# Altium footprint library 769BI_LTDC.PcbLib: 51 footprints (part 2 of 4)
Each footprint in its own frame and in the unit in brackets; x right, y up, seen from the top. Pads: shape width x height; smd on the part's side, far side on the other; paste and mask are expansions set on the pad; w line width, h text height; cw(c..) or ccw(c..) is an arc to the next point about the centre after c.
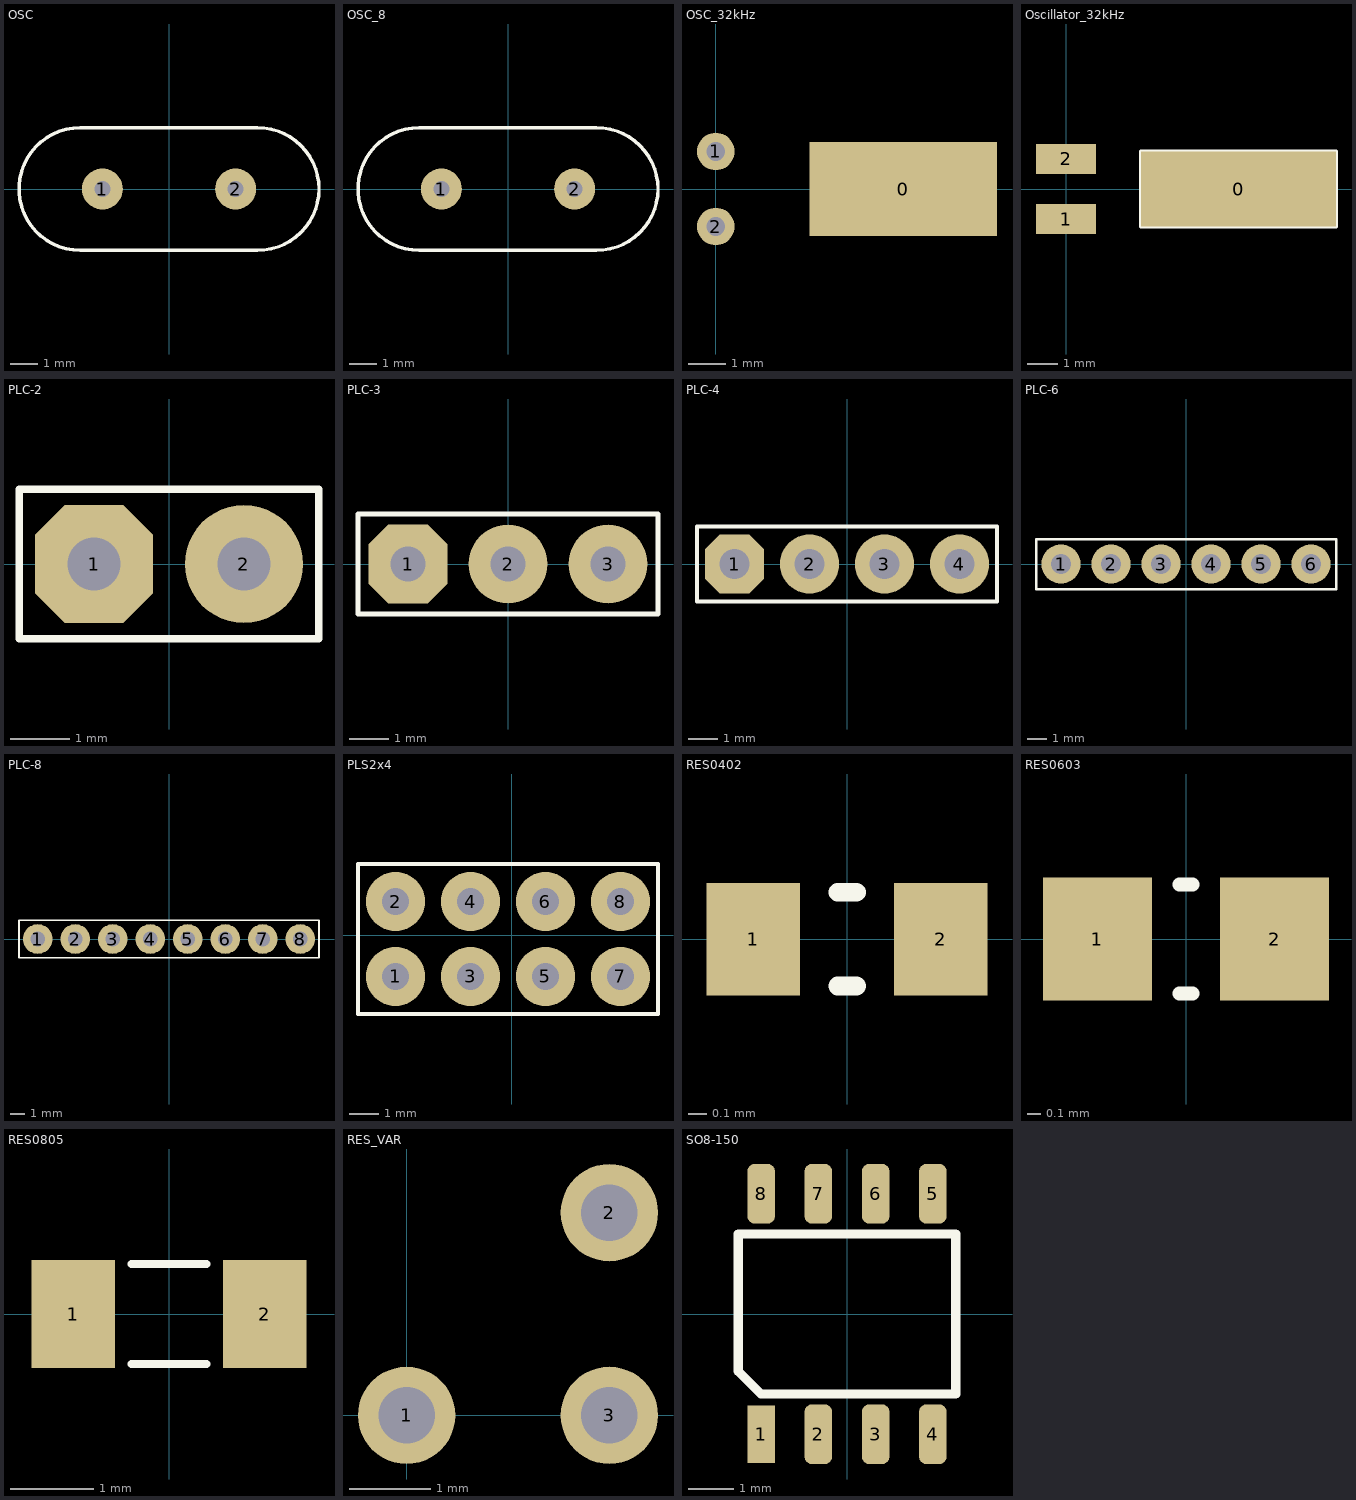
[diagram p1: the footprints below, top view; thin cyan lines are the x and y axes]

## OSC [mm]
pads (2):
  round 1.5 hole 0.6: 1(-2.44,0) 2(2.44,0)
Top Overlay:
  lines w0.127: 3.239,-2.25 -3.25,-2.25 cw(c-3.25,0) -3.25,2.25 3.24,2.25 cw(c3.25,0) 3.239,-2.25
3D body "HP49US.STEP": height 3.7, standoff -2.5, extent -5.5,-2.25 5.5,2.25

## OSC_8 [mm]
pads (2):
  round 1.5 hole 0.6: 1(-2.44,0) 2(2.44,0)
Top Overlay:
  lines w0.127: 3.239,-2.25 -3.25,-2.25 cw(c-3.25,0) -3.25,2.25 3.24,2.25 cw(c3.25,0) 3.239,-2.25
3D body "HP49US.STEP": height 3.7, standoff -2.5, extent -5.5,-2.25 5.5,2.25

## OSC_32kHz [mm]
pads (3):
  rect 5x2.5 smd: 0(5,0)
  round 1 hole 0.5: 1(0,1) 2(0,-1)
3D body "User Library-DT-26-1.STEP": height 3, standoff -1, extent 0.11,-1 7.25,1

## Oscillator_32kHz [mm]
pads (3):
  rect 6.5x2.5 smd: 0(5.75,0)
  rect 2x1 smd: 1(0,-1) 2(0,1)
Top Overlay:
  lines w0.127: 2.5,-1.25 2.5,1.25 9,1.25 9,1 9,-1 9,-1.25 2.5,-1.25
3D body "User Library-DT-26-1.STEP": height 1, standoff -3, extent 1.43,-1 8.57,1

## PCBComponent_1 [mm]

## PLC-2 [mm]
pads (2):
  oct 2x2 hole 0.9: 1(-1.27,0)
  round 2 hole 0.9: 2(1.27,0)
Top Overlay:
  lines w0.127: -2.54,-1.27 2.54,-1.27 2.54,1.27 -2.54,1.27 -2.54,-1.27
3D body "HN-1x2.STEP": height 10.1, standoff -1.5, extent -2.54,-1.27 2.54,1.27

## PLC-3 [mm]
pads (3):
  oct 2x2 hole 0.9: 1(-2.54,0)
  round 2 hole 0.9: 2(0,0) 3(2.54,0)
Top Overlay:
  lines w0.127: -3.81,-1.27 3.81,-1.27 3.81,1.27 -3.81,1.27 -3.81,-1.27
3D body "HN-1x3.STEP": height 10.1, standoff -1.5, extent -3.81,-1.27 3.81,1.27

## PLC-4 [mm]
pads (4):
  oct 2x2 hole 1: 1(-3.81,0)
  round 2 hole 1: 2(-1.27,0) 3(1.27,0) 4(3.81,0)
Top Overlay:
  lines w0.127: -5.08,-1.27 5.08,-1.27 5.08,1.27 -5.08,1.27 -5.08,-1.27
3D body "HN-1x4.STEP": height 10.1, standoff -1.5, extent -5.08,-1.27 5.08,1.27

## PLC-6 [mm]
pads (6):
  round 2 hole 1: 1(-6.35,0) 2(-3.81,0) 3(-1.27,0) 4(1.27,0) 5(3.81,0) 6(6.35,0)
Top Overlay:
  lines w0.127: -7.62,-1.27 7.62,-1.27 7.62,1.27 -7.62,1.27 -7.62,-1.27
3D body "HN-1x6.step": height 10.1, standoff -1.5, extent -7.62,-1.27 7.62,1.27

## PLC-8 [mm]
pads (8):
  round 2 hole 1: 1(-8.89,0) 2(-6.35,0) 3(-3.81,0) 4(-1.27,0) 5(1.27,0) 6(3.81,0) 7(6.35,0) 8(8.89,0)
Top Overlay:
  lines w0.127: -10.16,-1.27 10.16,-1.27 10.16,1.27 -10.16,1.27 -10.16,-1.27
3D body "HN-1x8.step": height 10.1, standoff -1.5, extent -10.16,-1.27 10.16,1.27

## PLS2x4 [mm]
pads (8):
  round 2 hole 0.9: 1(-3.937,-1.397) 2(-3.937,1.143) 3(-1.397,-1.397) 4(-1.397,1.143) 5(1.143,-1.397) 6(1.143,1.143) 7(3.683,-1.397) 8(3.683,1.143)
Top Overlay:
  lines w0.127: -5.207,-2.667 4.953,-2.667 4.953,2.413 -5.207,2.413 -5.207,-2.667
3D body "HN-2x4.step": height 10.1, standoff -2.5, extent -5.207,-2.667 4.953,2.413

## RES0402 [mm] "resistor 0402 reflow soldering"
pads (2):
  rect 0.5x0.6 smd: 1(-0.5,0) 2(0.5,0)
Top Overlay:
  lines w0.1: -0.05,-0.25 0.05,-0.25 ; -0.05,0.25 0.05,0.25
3D body "RES0402.stp": height 0.3, standoff 0, extent -0.5,-0.25 0.5,0.25

## RES0603 [mm] "resistor 0603 reflow soldering"
pads (2):
  rect 0.8x0.9 smd: 1(-0.65,0) 2(0.65,0)
Top Overlay:
  lines w0.1: -0.05,-0.4 0.05,-0.4 ; -0.05,0.4 0.05,0.4
3D body "res0603.stp": height 0.45, standoff 0, extent -0.8,-0.4 0.8,0.4

## RES0805 [mm] "resistor 0805 wave soldering"
pads (2):
  rect 1x1.3 smd: 1(-1.15,0) 2(1.15,0)
Top Overlay:
  lines w0.1: -0.45,-0.6 0.45,-0.6 ; -0.45,0.6 0.45,0.6
3D body "RES0805.stp": height 0.5, standoff 0, extent -1,-0.625 1,0.625

## RES_VAR [mm]
pads (3):
  round 1.2 hole 0.7: 1(0,0) 2(2.5,2.5) 3(2.5,0)

## SO8-150 [mil]
pads (8):
  rect 24x50 smd mask+4: 1(-75,-105)
  rrect50% 24x52 smd mask+4: 2(-25,-105) 3(25,-105) 4(75,-105) 5(75,105) 6(25,105) 7(-25,105) 8(-75,105)
Top Overlay:
  lines w8: -95.01,-49.99 -95.01,70 95,70 95,-70 -75,-70 -95.01,-49.99
3D body "SO8-150.STEP": height 67, standoff 0, extent -95.01,-122.01 94.99,121.99